# Altium footprint library DR-WiFi Servo.PcbLib: 44 footprints (part 3 of 3)
Each footprint in its own frame and in the unit in brackets; x right, y up, seen from the top. Pads: shape width x height; smd on the part's side, far side on the other; paste and mask are expansions set on the pad; w line width, h text height; cw(c..) or ccw(c..) is an arc to the next point about the centre after c.
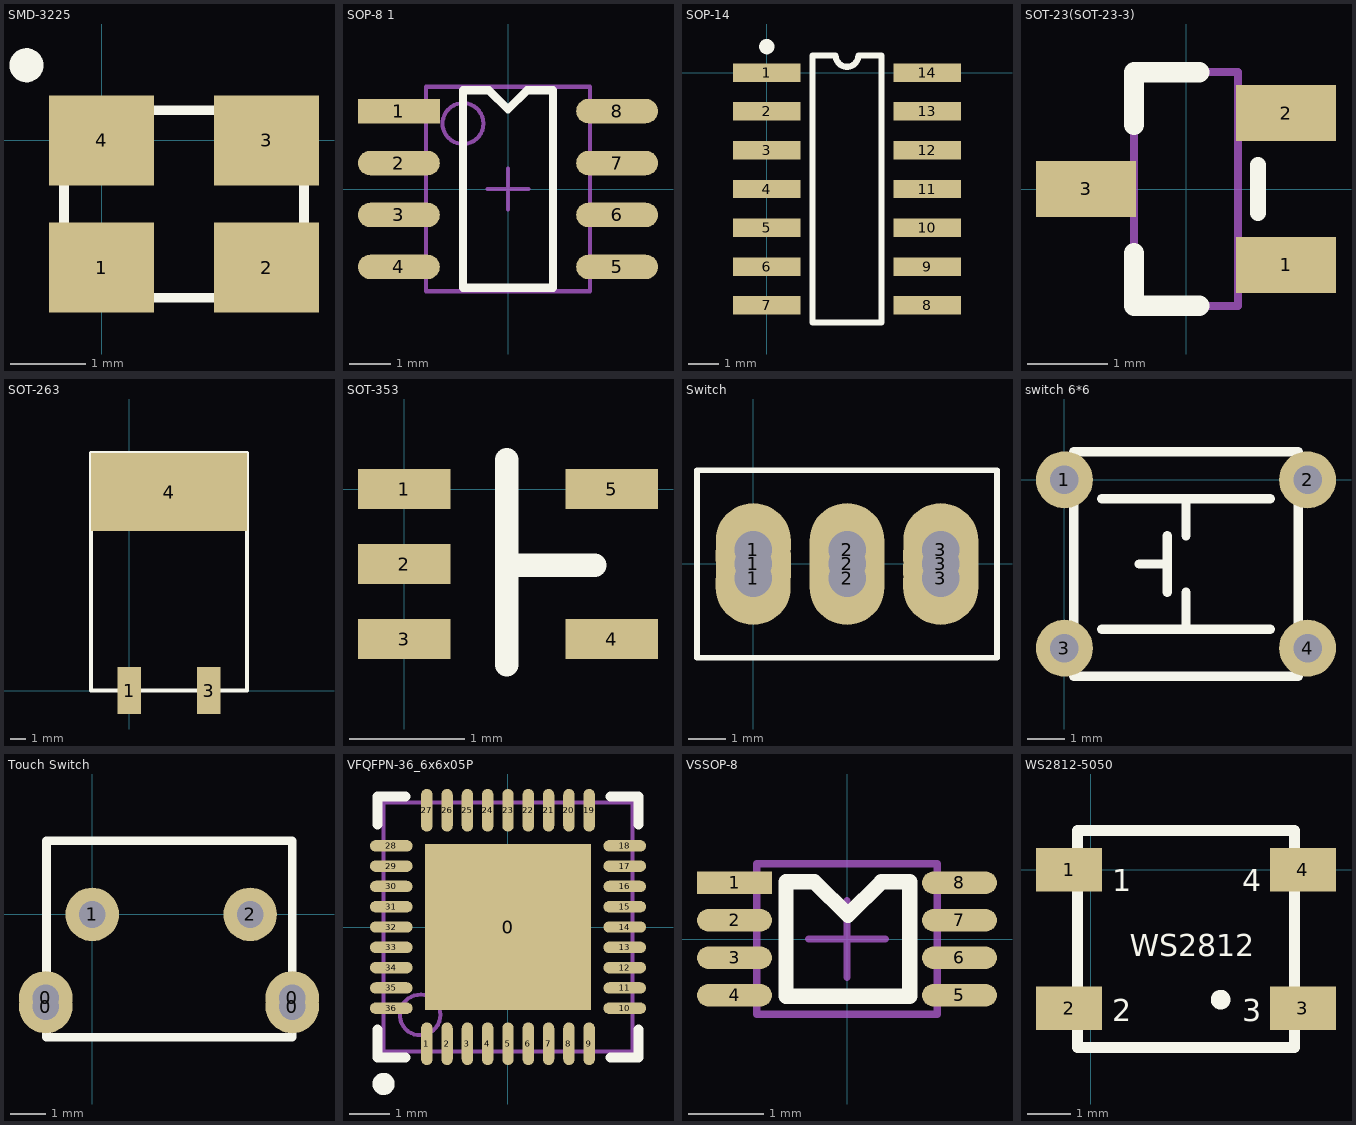
[diagram p2: the footprints below, top view; thin cyan lines are the x and y axes]

## SMD-3225 [mm]
pads (4):
  rect 1.4x1.2 smd: 1(0,-1.7) 2(2.2,-1.7) 3(2.2,0) 4(0,0)
Top Overlay:
  circle w0.254: c-1,1 r0.1
  lines w0.127: -0.5,-1.1 -0.5,-0.6 ; 0.7,-2.1 1.5,-2.1 ; 0.7,0.4 1.5,0.4 ; 2.7,-1.1 2.7,-0.6
3D body: height 0.5, standoff 0, extent -0.513,-2.113 2.687,0.387

## SOP-8 1 [mm]
height 2.62
pads (8):
  rect 2x0.6 smd: 1(-2.667,1.905)
  oval 2x0.6 smd: 2(-2.667,0.635) 3(-2.667,-0.635) 4(-2.667,-1.905) 5(2.667,-1.905) 6(2.667,-0.635) 7(2.667,0.635) 8(2.667,1.905)
Top Overlay:
  lines w0.2: -1.1,-2.413 1.1,-2.413 1.1,2.413 0.463,2.413 0,1.95 -0.463,2.413 -1.1,2.413 -1.1,-2.413
Mechanical 13:
  circle w0.1: c-1.1,1.6 r0.5
  lines w0.1: -2,-2.5 2,-2.5 2,2.5 -2,2.5 -2,-2.5
Mechanical 15:
  lines w0.1: -0.5,0 0.5,0 ; 0,-0.5 0,0.5
3D body: height 1.6, standoff 0, extent -3.051,-2.51 2.991,2.51

## SOP-14 [mm]
pads (14):
  rect 2.2x0.6 smd: 1(0,0) 2(0,-1.27) 3(0,-2.54) 4(0,-3.81) 5(0,-5.08) 6(0,-6.35) 7(0,-7.62) 8(5.25,-7.62) 9(5.25,-6.35) 10(5.25,-5.08) 11(5.25,-3.81) 12(5.25,-2.54) 13(5.25,-1.27) 14(5.25,0)
Top Overlay:
  circle w0.25: c0,0.85 r0.125
  lines w0.2: 1.5,-8.185 1.5,0.565 2.25,0.565 ccw(c2.625,0.565) 3,0.565 3.75,0.565 3.75,-8.185 1.5,-8.185
3D body: height 1.55, standoff -0.05, extent -0.366,-8.157 5.624,0.533

## SOT-23(SOT-23-3) [mm]
pads (3):
  rect 1.25x0.7 smd: 1(1.25,-0.95) 2(1.25,0.95) 3(-1.25,0)
Top Overlay:
  lines w0.2: 0.9,-0.3 0.9,0.3
  lines w0.254: -0.65,-0.8 -0.65,-1.46 0.165,-1.46 ; 0.165,1.46 -0.65,1.46 ; -0.65,0.8 -0.65,1.46 ; -0.65,0.8 -0.65,1.46 ; -0.65,0.8 -0.65,1.46
Mechanical 13:
  lines w0.1: -0.65,-1.46 -0.65,1.46 ; -0.65,-1.46 0.65,-1.46 ; -0.65,-1.46 -0.65,1.46 ; -0.65,-1.46 0.65,-1.46 ; -0.65,-1.46 0.65,-1.46 ; -0.65,-1.46 -0.65,1.46 ; -0.65,1.46 0.65,1.46 ; -0.65,1.46 0.65,1.46 ; -0.65,1.46 0.65,1.46 ; 0.65,-1.46 0.65,1.46 ; 0.65,-1.46 0.65,1.46 ; 0.65,-1.46 0.65,1.46
3D body: height 1.3, standoff 0, extent -1.5,-1.5 1.5,1.5

## SOT-263 [mm]
pads (3):
  rect 1.5x3 smd: 1(0,0) 3(5.08,0)
  rect 10x5 smd: 4(2.54,12.7)
Top Overlay:
  lines w0.254: -2.46,0 -2.46,15.2 7.54,15.2 7.54,0 -2.46,0

## SOT-353 [mm]
height 0.9
pads (5):
  rect 0.8x0.35 smd: 1(0,0) 2(0,-0.65) 3(0,-1.3) 4(1.8,-1.3) 5(1.8,0)
Top Overlay:
  lines w0.203: 0.889,-1.524 0.889,0.254 ; 0.889,-0.66 1.651,-0.66
3D body: height 1.1, standoff 0, extent -0.29,-1.75 2.11,0.45

## Switch [mil]
pads (9):
  oval 80x100 hole 40: 1(0,-15) 1(0,15) 1(0,0) 2(100,0) 2(100,-15) 2(100,15) 3(200,-15) 3(200,0) 3(200,15)
Top Overlay:
  lines w6: -60,-100 260,-100 260,100 -60,100 -60,-100

## switch 6*6 [mil]
pads (4):
  round 60 hole 30: 1(0,0) 2(255.91,0) 3(0,-177.17) 4(255.91,-177.17)
Top Overlay:
  lines w10: 39.37,-157.48 216.54,-157.48 ; 39.37,-19.68 216.54,-19.68 ; 108.27,-118.11 108.27,-59.06 ; 108.27,-88.58 78.74,-88.58 ; 127.95,-157.48 127.95,-118.11 ; 127.95,-59.06 127.95,-19.68 ; 78.74,-88.58 78.74,-88.58 ; 9.84,-206.69 246.06,-206.69 246.06,29.53 9.84,29.53 9.84,-206.69
3D body: height 377.95, standoff -19.68, extent -3.95,-206.69 259.84,29.53

## Touch Switch [mil]
pads (6):
  round 60 hole 30: 0(-52.17,-103.35) 0(-52.17,-93.5) 0(224.41,-103.35) 0(224.41,-93.5) 1(0,0) 2(177.17,0)
Top Overlay:
  lines w10: -51.18,-137.8 88.58,-137.8 224.41,-137.8 224.41,82.68 -51.18,82.68 -51.18,-137.8

## VFQFPN-36_6x6x05P [mm]
pads (37):
  rect 4.1x4.1 smd mask+0.051: 0(0,0)
  oval 0.28x1.05 smd mask+0.051: 1(-2,-2.875) 2(-1.5,-2.875) 3(-1,-2.875) 4(-0.5,-2.875) 5(0,-2.875) 6(0.5,-2.875) 7(1,-2.875) 8(1.5,-2.875) 9(2,-2.875) 19(2,2.875) 20(1.5,2.875) 21(1,2.875) 22(0.5,2.875) 23(0,2.875) 24(-0.5,2.875) 25(-1,2.875) 26(-1.5,2.875) 27(-2,2.875)
  oval 1.05x0.28 smd mask+0.051: 10(2.875,-2) 11(2.875,-1.5) 12(2.875,-1) 13(2.875,-0.5) 14(2.875,0) 15(2.875,0.5) 16(2.875,1) 17(2.875,1.5) 18(2.875,2) 28(-2.875,2) 29(-2.875,1.5) 30(-2.875,1) 31(-2.875,0.5) 32(-2.875,0) 33(-2.875,-0.5) 34(-2.875,-1) 35(-2.875,-1.5) 36(-2.875,-2)
Top Overlay:
  circle w0.3: c-3.065,-3.865 r0.125
  lines w0.254: -3.215,-2.525 -3.215,-3.215 -2.525,-3.215 ; -3.215,2.525 -3.215,3.215 -2.525,3.215 ; 2.525,-3.215 3.215,-3.215 3.215,-2.525 ; 2.525,3.215 3.215,3.215 3.215,2.525
Mechanical 13:
  circle w0.1: c-2.165,-2.165 r0.5
  lines w0.1: -3.065,-3.065 -3.065,3.065 3.065,3.065 3.065,-3.065 -3.065,-3.065
3D body: height 0.9, standoff 0, extent -3,-3 3,3

## VSSOP-8 [mm]
height 1.1
pads (8):
  rect 1x0.3 smd: 1(-1.5,0.75)
  oval 1x0.3 smd: 2(-1.5,0.25) 3(-1.5,-0.25) 4(-1.5,-0.75) 5(1.5,-0.75) 6(1.5,-0.25) 7(1.5,0.25) 8(1.5,0.75)
Top Overlay:
  lines w0.203: -0.813,-0.762 0.838,-0.762 0.838,0.762 0.457,0.762 0.013,0.318 -0.432,0.762 -0.813,0.762 -0.813,-0.762
Mechanical 13:
  lines w0.1: -1.2,-1 -1.2,1 1.2,1 1.2,-1 -1.2,-1
Mechanical 15:
  lines w0.1: -0.508,0 0.508,0 ; 0,-0.508 0,0.508
3D body: height 0.9, standoff 0, extent -1.6,-1.041 1.6,1.059

## WS2812-5050 [mm]
pads (4):
  rect 1.524x1 smd: 1(-0.5,0) 2(-0.5,-3.2) 3(4.9,-3.2) 4(4.9,0)
Top Overlay:
  circle w0.254: c3,-3 r0.1
  lines w0.254: -0.3,-4.1 4.7,-4.1 4.7,0.9 -0.3,0.9 -0.3,-4.1
  text "WS2812" at 0.9,-2 h0.51
  text "3" at 3.5,-3.5 h0.51
  text "2" at 0.5,-3.5 h0.51
  text "1" at 0.5,-0.5 h0.51
  text "4" at 3.5,-0.5 h0.51
3D body: height 2, standoff 0, extent -0.8,-4.1 5.2,0.9